# Altium footprint library MS-Electronic.PcbLib: 213 footprints (part 12 of 14)
Each footprint in its own frame and in the unit in brackets; x right, y up, seen from the top. Pads: shape width x height; smd on the part's side, far side on the other; paste and mask are expansions set on the pad; w line width, h text height; cw(c..) or ccw(c..) is an arc to the next point about the centre after c.
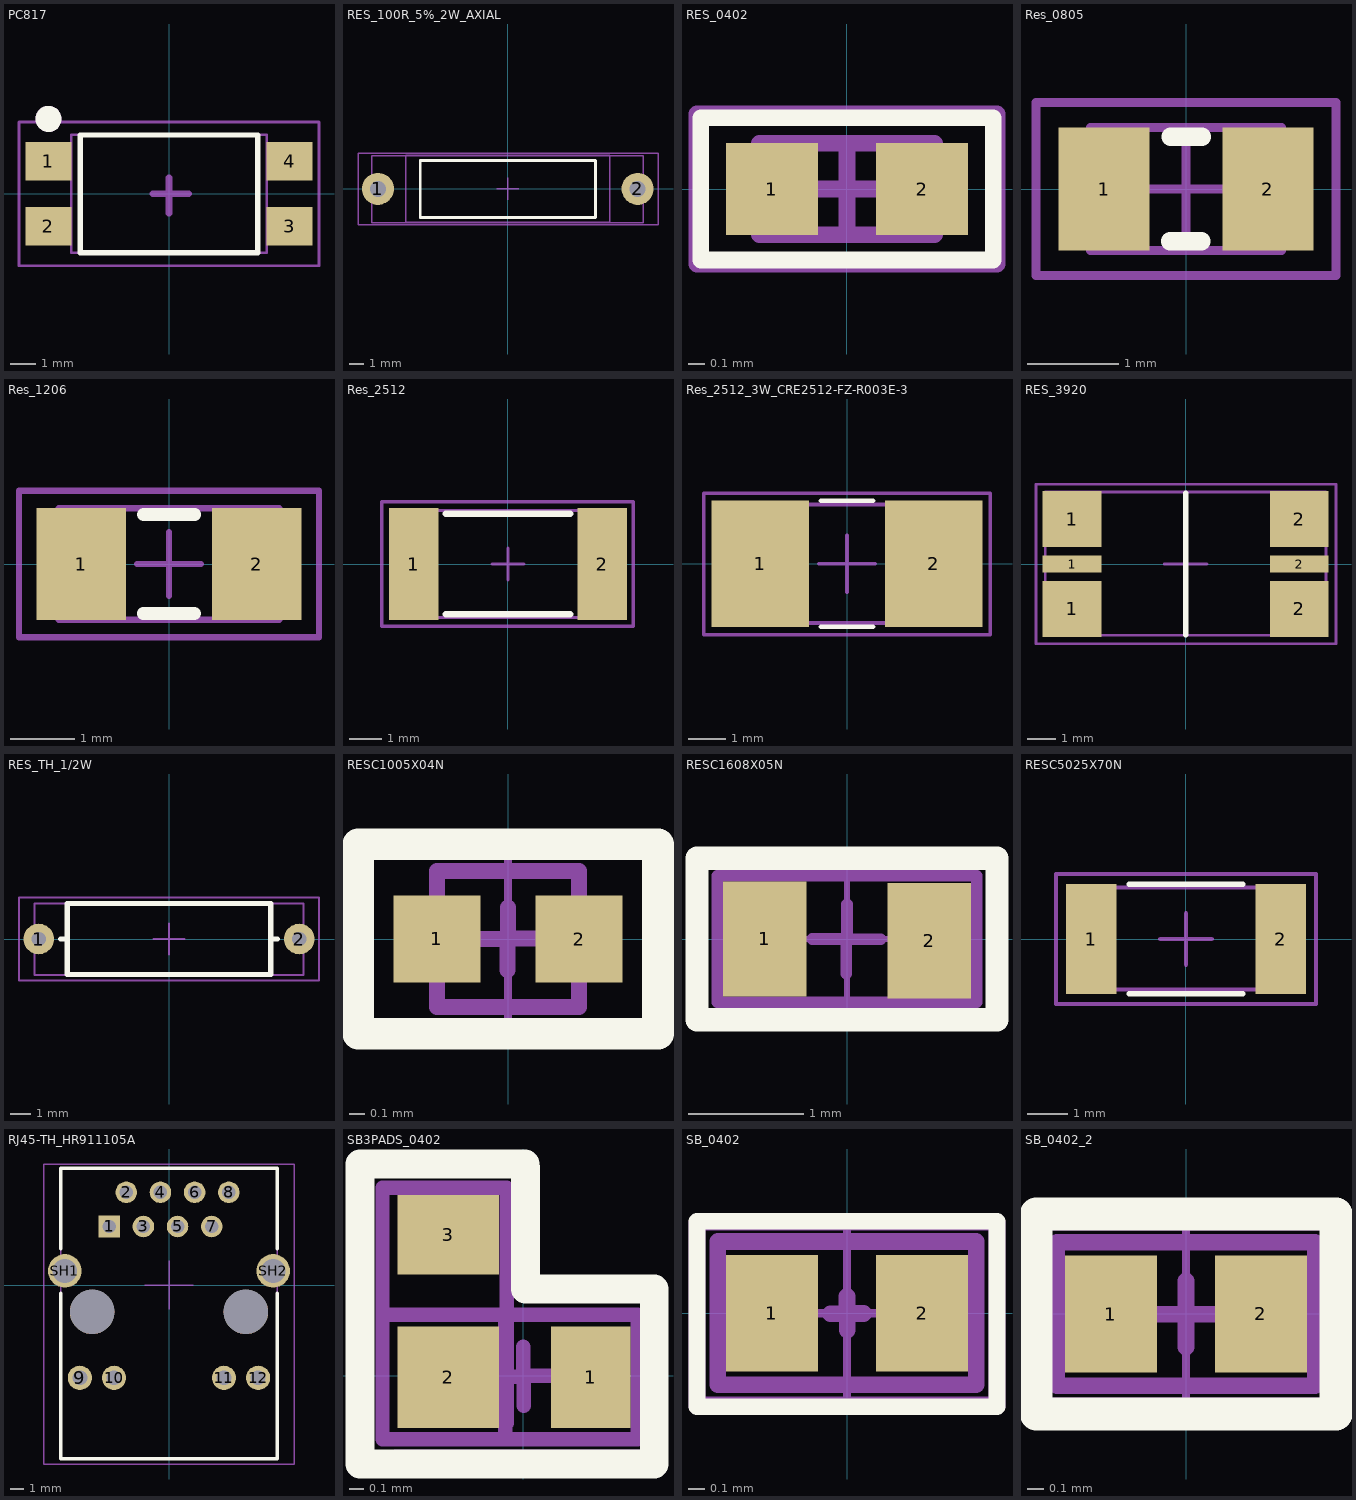
[diagram p11: the footprints below, top view; thin cyan lines are the x and y axes]

## PC817 [mm]
pads (4):
  rect 1.79x1.5 smd: 1(-4.705,1.27) 2(-4.705,-1.27) 3(4.705,-1.27) 4(4.705,1.27)
Top Overlay:
  circle w0.508: c-4.699,2.921 r0.254
  lines w0.2: -3.46,-2.3 3.46,-2.3 3.46,2.3 -3.46,2.3 -3.46,-2.3
Top Assembly:
  circle w0.508: c-4.699,2.921 r0.254
  lines w0.1: -3.81,-2.3 3.81,-2.3 3.81,2.3 -3.81,2.3 -3.81,-2.3
  text "'.Designator'" at -8.887,-1.397 h1.52
Top Component Center (Mech15):
  lines w0.1: -5.85,-2.8 5.85,-2.8 5.85,2.8 -5.85,2.8 -5.85,-2.8
  lines w0.254: -0.635,0 0.762,0 ; 0,-0.762 0,0.635 0,0
3D body "User Library-PC817_Gullwing.STEP": height 3.86, standoff 0.01, extent -5,-2.29 5,2.29

## RES_100R_5%_2W_AXIAL [mm]
pads (2):
  round 2.2 hole 1.1: 1(-8.9,0) 2(8.9,0)
Top Overlay:
  lines w0.2: -6,-1.95 -6,1.95 6,1.95 6,-1.95 -6,-1.95
Top Assembly:
  lines w0.1: -9.322,-2.311 -9.322,2.286 9.271,2.286 9.271,-2.311 -9.322,-2.311
  text ".Designator" at -2.499,-0.167 h0.5
Top Component Center (Mech15):
  lines w0.1: -0.762,0 0,0 ; 0,-0.762 0,0 ; 0,0.762 0,0 ; 0.762,0 0,0 ; -10.265,-2.465 10.295,-2.469 10.295,2.448 -10.265,2.452 -10.265,-2.465
Mechanical 38:
  lines w0.1: -7,-2.3 -7,2.3 7,2.3 7,-2.3 -7,-2.3
3D body "RES_AH_1W_700mil_0R_5%.STEP": height 4.78, standoff -4.7, extent -9.29,-2.277 9.29,2.277

## RES_0402 [mm]
height 0.4
pads (2):
  rect 0.55x0.55 smd: 1(-0.45,0) 2(0.45,0)
Top Overlay:
  lines w0.1: -0.877,-0.426 -0.877,0.427 0.878,0.427 0.878,-0.426 -0.877,-0.426
Top Assembly:
  lines w0.1: -0.525,-0.275 -0.525,0.275 0.525,0.275 0.525,-0.275 -0.525,-0.275
  text ".Designator" at -1.1,-0.073 h0.22
Top Component Center (Mech15):
  lines w0.1: -0.275,0 0.275,0 ; 0,-0.275 0,0.275 ; -0.9,-0.45 -0.9,0.45 0.9,0.45 0.9,-0.45 -0.9,-0.45
3D body "Res_RC0402JR-0710KL.step": height 0.4, standoff 0, extent -0.525,-0.275 0.525,0.275

## Res_0805 [mm]
height 0.6
pads (2):
  rect 1x1.35 smd: 1(-0.9,0) 2(0.9,0)
Top Overlay:
  lines w0.2: -0.176,-0.575 0.172,-0.575 ; -0.172,0.575 0.176,0.575
Top Assembly:
  lines w0.1: -1.05,-0.675 -1.05,0.675 1.05,0.675 1.05,-0.675 -1.05,-0.675
  text ".Designator" at -2.499,-0.167 h0.5
Top Component Center (Mech15):
  lines w0.1: -0.5,0 0.5,0 ; 0,-0.5 0,0.5 ; -1.65,-0.95 -1.65,0.95 1.65,0.95 1.65,-0.95 -1.65,-0.95
3D body "Res_0805.step": height 0.6, standoff 0, extent -1.05,-0.675 1.05,0.675

## Res_1206 [mm]
height 0.7
pads (2):
  rect 1.4x1.75 smd: 1(-1.375,0) 2(1.375,0)
Top Overlay:
  lines w0.2: -0.403,-0.775 0.401,-0.775 ; -0.401,0.775 0.403,0.775
Top Assembly:
  lines w0.1: -1.725,-0.875 -1.725,0.875 1.725,0.875 1.725,-0.875 -1.725,-0.875
  text ".Designator" at -2.999,-0.2 h0.6
Top Component Center (Mech15):
  lines w0.1: -0.5,0 0.5,0 ; 0,-0.5 0,0.5 ; -2.35,-1.15 -2.35,1.15 2.35,1.15 2.35,-1.15 -2.35,-1.15
3D body "Res_1206.step": height 0.7, standoff 0, extent -1.725,-0.875 1.725,0.875

## Res_2512 [mm]
height 0.65
pads (2):
  rect 1.55x3.5 smd: 1(-2.95,0) 2(2.95,0)
Top Overlay:
  lines w0.2: -1.95,-1.575 1.95,-1.575 ; -1.95,1.575 1.95,1.575
Top Assembly:
  lines w0.1: -3.225,-1.675 3.225,-1.675 3.225,1.675 -3.225,1.675 -3.225,-1.675
  text ".Designator" at -2.999,-0.2 h0.6
Top Component Center (Mech15):
  lines w0.1: -0.5,0 0.5,0 ; 0,-0.5 0,0.5 ; -3.955,-1.95 3.927,-1.95 3.927,1.95 -3.955,1.95 -3.955,-1.95
3D body "Res_2512.step": height 0.65, standoff 0, extent -3.225,-1.675 3.225,1.675

## Res_2512_3W_CRE2512-FZ-R003E-3 [mm]
pads (2):
  rect 2.64x3.42 smd: 1(-2.34,0) 2(2.34,0)
Top Overlay:
  lines w0.127: -0.7,-1.7 0.7,-1.7 ; -0.7,1.7 0.7,1.7
Top Assembly:
  lines w0.1: -3.2,-1.598 3.203,-1.598 3.203,1.6 -3.2,1.6 -3.2,-1.598
  text ".Designator" at -2.499,-0.167 h0.5
Top Component Center (Mech15):
  lines w0.1: -0.762,0 0,0 ; 0,-0.762 0,0 ; 0,0.762 0,0 ; 0.762,0 0,0 ; -3.866,-1.913 3.864,-1.913 3.864,1.904 -3.866,1.904 -3.866,-1.913
3D body "step_temp.STEP": height 0.9, standoff 0, extent -3.2,-1.6 3.2,1.6

## RES_3920 [mm]
pads (6):
  rect 2.1x2 smd: 1(-4.05,-1.6) 1(-4.05,1.6) 2(4.05,-1.6) 2(4.05,1.6)
  rect 2.1x0.6 smd: 1(-4.05,0) 2(4.05,0)
Top Overlay:
  lines w0.2: 0,-2.525 0,2.525
Top Assembly:
  lines w0.1: 5,-2.54 5,2.565 -5.004,2.565 -5.004,-2.54 5.004,-2.54
  text ".Designator" at -4.998,-0.333 h1
Top Component Center (Mech15):
  lines w0.1: -0.762,0 0,0 ; 0,-0.762 0,0 ; 0,0.762 0,0 ; 0.762,0 0,0 ; -5.334,-2.845 -5.334,2.845 5.359,2.845 5.359,-2.845 -5.334,-2.845
3D body "3920_shunt_resistor v1.step": height 1, standoff 0, extent -5.003,-2.54 4.997,2.56

## RES_TH_1/2W [mm]
pads (2):
  round 1.5 hole 0.7: 1(-6.4,0) 2(6.4,0)
Top Overlay:
  lines w0.254: -5.334,0 -5.08,0 ; 5.08,0 5.334,0 ; -5,-1.75 5,-1.75 5,1.75 -5,1.75 -5,-1.75
Top Assembly:
  lines w0.1: -6.604,-1.778 6.604,-1.778 6.604,1.744 -6.604,1.744 -6.604,-1.778
  text ".Designator" at -4.998,-0.333 h1
Top Component Center (Mech15):
  lines w0.1: -0.762,0 0,0 ; 0,-0.762 0,0 ; 0,0.762 0,0 ; 0.762,0 0,0 ; -7.366,-2.032 -7.366,2.032 7.366,2.032 7.366,-2.032 -7.366,-2.032
3D body "Resistro_0.5w.STEP": height 3.5, standoff -3, extent -6.62,-1.75 6.62,1.75

## RESC1005X04N [mm] "Chip Resistor, 2-Leads, Body 1.00x0.50mm (0402)"
height 0.4
pads (2):
  rect 0.55x0.55 smd: 1(-0.45,0) 2(0.45,0)
Top Overlay:
  lines w0.2: -0.95,-0.6 -0.95,0.6 0.95,0.6 0.95,-0.6 -0.95,-0.6
Top Assembly:
  lines w0.1: -0.45,-0.43 0.45,-0.43 0.45,0.43 -0.45,0.43 -0.45,-0.43
  text ".Designator" at -2.499,-0.167 h0.5
Top Component Center (Mech15):
  lines w0.1: -0.203,0.001 -0.003,0.001 ; -0.003,-0.198 -0.003,0.002 ; -0.003,0.004 0.197,0.004 ; 0,0 0,0.2 ; -0.95,-0.6 0.95,-0.6 0.95,0.6 -0.95,0.6 -0.95,-0.6
Mechanical 17:
  lines w0.05: -0.5,0 0.5,0 ; 0,-0.5 0,0.5 ; -0.9,-0.525 -0.9,0.525 0.9,0.525 0.9,-0.525 -0.9,-0.525
3D body "RESC1005X04N.step": height 0.35, standoff 0, extent -0.5,-0.25 0.5,0.25

## RESC1608X05N [mm] "Chip Resistor, 2-Leads, Body 1.60x0.80mm (0603)"
height 0.5
pads (2):
  rect 0.725x1 smd: 1(-0.713,0) 2(0.712,-0.016)
Top Overlay:
  lines w0.2: -1.3,-0.7 1.3,-0.7 1.3,0.7 -1.3,0.7 -1.3,-0.7
Top Assembly:
  lines w0.1: 1.125,-0.55 1.125,-0.55 ; 1.125,-0.55 1.125,0.55 -1.125,0.55 -1.125,-0.55 1.125,-0.55
  text ".Designator" at -2.499,-0.167 h0.5
Bottom 3D Body:
  lines w0.1: -1.125,-0.55 -1.125,0.55 1.125,0.55 1.125,-0.55 -1.125,-0.55
Top Component Center (Mech15):
  lines w0.1: -0.3,0 0,0 0,0.3 ; -0.006,-0.302 -0.006,-0.002 0.294,-0.002 ; 1.3,-0.7 1.3,-0.7 ; 1.3,-0.7 1.3,0.7 -1.3,0.7 -1.3,-0.7 1.3,-0.7
Mechanical 17:
  lines w0.05: -0.5,0 0.5,0 ; 0,-0.5 0,0.5 ; -1.3,-0.7 -1.3,0.7 1.3,0.7 1.3,-0.7 -1.3,-0.7
3D body "RESC1608X05N.step": height 0.45, standoff 0, extent -0.775,-0.425 0.775,0.425

## RESC5025X70N [mm]
pads (2):
  rect 1.24x2.72 smd mask+0.07: 1(-2.34,0) 2(2.34,0)
Top Overlay:
  lines w0.127: -1.4,-1.35 1.4,-1.35 ; -1.4,1.35 1.4,1.35
Top Assembly:
  lines w0.1: -2.489,-1.245 -2.489,1.27 2.515,1.27 2.515,-1.245 -2.489,-1.245
  text ".Designator" at -2.499,-0.167 h0.5
Top Component Center (Mech15):
  lines w0.1: -0.635,0 0,0 ; 0,-0.635 0,0 ; 0,0.635 0,0 ; 0.635,0 0,0 ; -3.208,-1.608 3.208,-1.608 3.208,1.608 -3.208,1.608 -3.208,-1.608
3D body "ERJ-12ZYJ470U.STEP": height 0.7, standoff 0, extent -2.5,-1.25 2.5,1.25

## RJ45-TH_HR911105A [mm]
pads (16):
  rect 1.6x1.6 hole 1: 1(-4.445,4.355)
  round 1.6 hole 1: 2(-3.175,6.895) 3(-1.905,4.355) 4(-0.635,6.895) 5(0.635,4.355) 6(1.905,6.895) 7(3.175,4.355) 8(4.445,6.895)
  round 1.8 hole 1.1: 9(-6.625,-6.895) 10(-4.085,-6.895) 11(4.085,-6.895) 12(6.625,-6.895)
  round 2.5 hole 1.8: SH1(-7.745,1.055) SH2(7.745,1.055)
  round 3.3 hole 3.3 unplated: ""(-5.715,-1.995) ""(5.715,-1.995)
Top Overlay:
  lines w0.254: -8.05,-0.615 -8.05,-12.915 8.05,-12.915 8.05,-0.615 ; -8.05,2.685 -8.05,8.685 8.05,8.685 ; 8.05,2.685 8.05,8.685
Top Assembly:
  lines w0.1: -8.05,-12.915 -8.05,8.685 8.05,8.685 8.05,-12.915 -8.05,-12.915
  text ".Designator" at -2.999,-0.2 h0.6
Top Component Center (Mech15):
  lines w0.1: -1.8,0 0,0 ; 0,-1.8 0,0 ; 0,1.8 0,0 ; 1.8,0 0,0 ; -9.3,-13.3 -9.3,9 9.3,9 9.3,1.1 9.3,-13.3 -9.3,-13.3
3D body "User Library-HR911105A.STEP": height 13.6, standoff -2.9, extent -7.935,-12.945 7.945,8.455

## SB3PADS_0402 [mm] "Solder Bridge 0 Ohm (0402)"
height 0.6
pads (3):
  rect 0.55x0.7 smd: 1(0.466,-0.009)
  rect 0.7x0.7 smd: 2(-0.517,-0.009)
  rect 0.7x0.55 smd: 3(-0.517,0.974)
Top Overlay:
  lines w0.2: -1.127,1.461 -1.127,-0.609 0.905,-0.609 0.905,0.6 ; -1.127,1.464 0.012,1.464 ; 0.016,0.6 0.88,0.6 ; 0.016,0.611 0.016,1.441
Top Assembly:
  lines w0.1: -0.972,-0.439 -0.972,1.299 -0.113,1.299 -0.113,0.421 0.791,0.421 0.791,-0.439 -0.972,-0.439
  text ".Designator" at -1.999,-0.136 h0.4
Bottom 3D Body:
  lines w0.1: -0.972,1.291 -0.972,-0.439 0.791,-0.439 0.791,0.421 -0.948,0.421 ; -0.972,1.299 -0.113,1.299 ; -0.123,-0.439 -0.123,0.421 ; -0.113,-0.327 -0.113,1.223
Top Component Center (Mech15):
  lines w0.1: -0.201,-0.006 0.002,-0.006 ; 0,0.2 0,-0.003 0.003,-0.003 ; 0.004,0.001 0.207,0.001 ; 0.005,-0.207 0.005,-0.003 ; -1.127,-0.609 -1.127,1.461 0.012,1.461 0.012,0.611 0.905,0.611 0.905,-0.609 -1.127,-0.609
Mechanical 17:
  lines w0.05: -0.884,-0.534 0.916,-0.534
3D body: height 0.25, standoff 0, extent -0.792,-0.052 -0.292,0.948

## SB_0402 [mm] "Solder Bridge 0 Ohm (0402)"
height 0.6
pads (2):
  rect 0.55x0.7 smd: 1(-0.45,0) 2(0.45,0)
Top Overlay:
  lines w0.1: -0.9,-0.562 0.9,-0.562 0.9,0.551 -0.9,0.551 -0.9,-0.562
Top Assembly:
  text ".Designator" at -1.5,-0.1 h0.3
Bottom 3D Body:
  lines w0.1: -0.775,-0.43 0.775,-0.43 0.775,0.43 -0.775,0.43 -0.775,-0.43
Top Component Center (Mech15):
  lines w0.1: -0.099,-0.004 0.001,-0.004 ; 0,0 0,0.1 ; 0.001,-0.103 0.001,-0.003 0.101,-0.002 ; -0.9,-0.558 -0.9,0.545 0.9,0.545 0.9,-0.558 -0.9,-0.558
Mechanical 17:
  lines w0.05: -0.5,0 0.5,0 ; 0,-0.5 0,0.5 ; -0.9,-0.525 0.9,-0.525 0.9,0.525 -0.9,0.525 -0.9,-0.525
3D body: height 0.25, standoff 0, extent -0.5,-0.25 0.5,0.25

## SB_0402_2 [mm]
pads (2):
  rect 0.55x0.7 smd: 1(-0.45,0) 2(0.45,0)
Top Overlay:
  lines w0.2: -0.9,-0.6 0.9,-0.6 0.9,0.6 -0.9,0.6 -0.9,-0.6
Top Assembly:
  text ".Designator" at -1.999,-0.133 h0.4
Bottom 3D Body:
  lines w0.1: -0.775,-0.43 0.775,-0.43 0.775,0.43 -0.775,0.43 -0.775,-0.43
Top Component Center (Mech15):
  lines w0.1: -0.197,-0.002 0.003,-0.002 ; 0,-0.2 0,0 0,0.2 ; 0,-0.002 0.2,-0.002 ; -0.9,-0.6 0.9,-0.6 0.9,0.6 -0.9,0.6 -0.9,-0.6
Mechanical 17:
  lines w0.05: -0.5,0 0.5,0 ; 0,-0.5 0,0.5 ; -0.9,-0.525 0.9,-0.525 0.9,0.525 -0.9,0.525 -0.9,-0.525
3D body: height 0.25, standoff 0, extent -0.5,-0.25 0.5,0.25